# Altium footprint library burglar_alarm_system_Pcb_Lib.PcbLib: 36 footprints (part 1 of 3)
Each footprint in its own frame and in the unit in brackets; x right, y up, seen from the top. Pads: shape width x height; smd on the part's side, far side on the other; paste and mask are expansions set on the pad; w line width, h text height; cw(c..) or ccw(c..) is an arc to the next point about the centre after c.
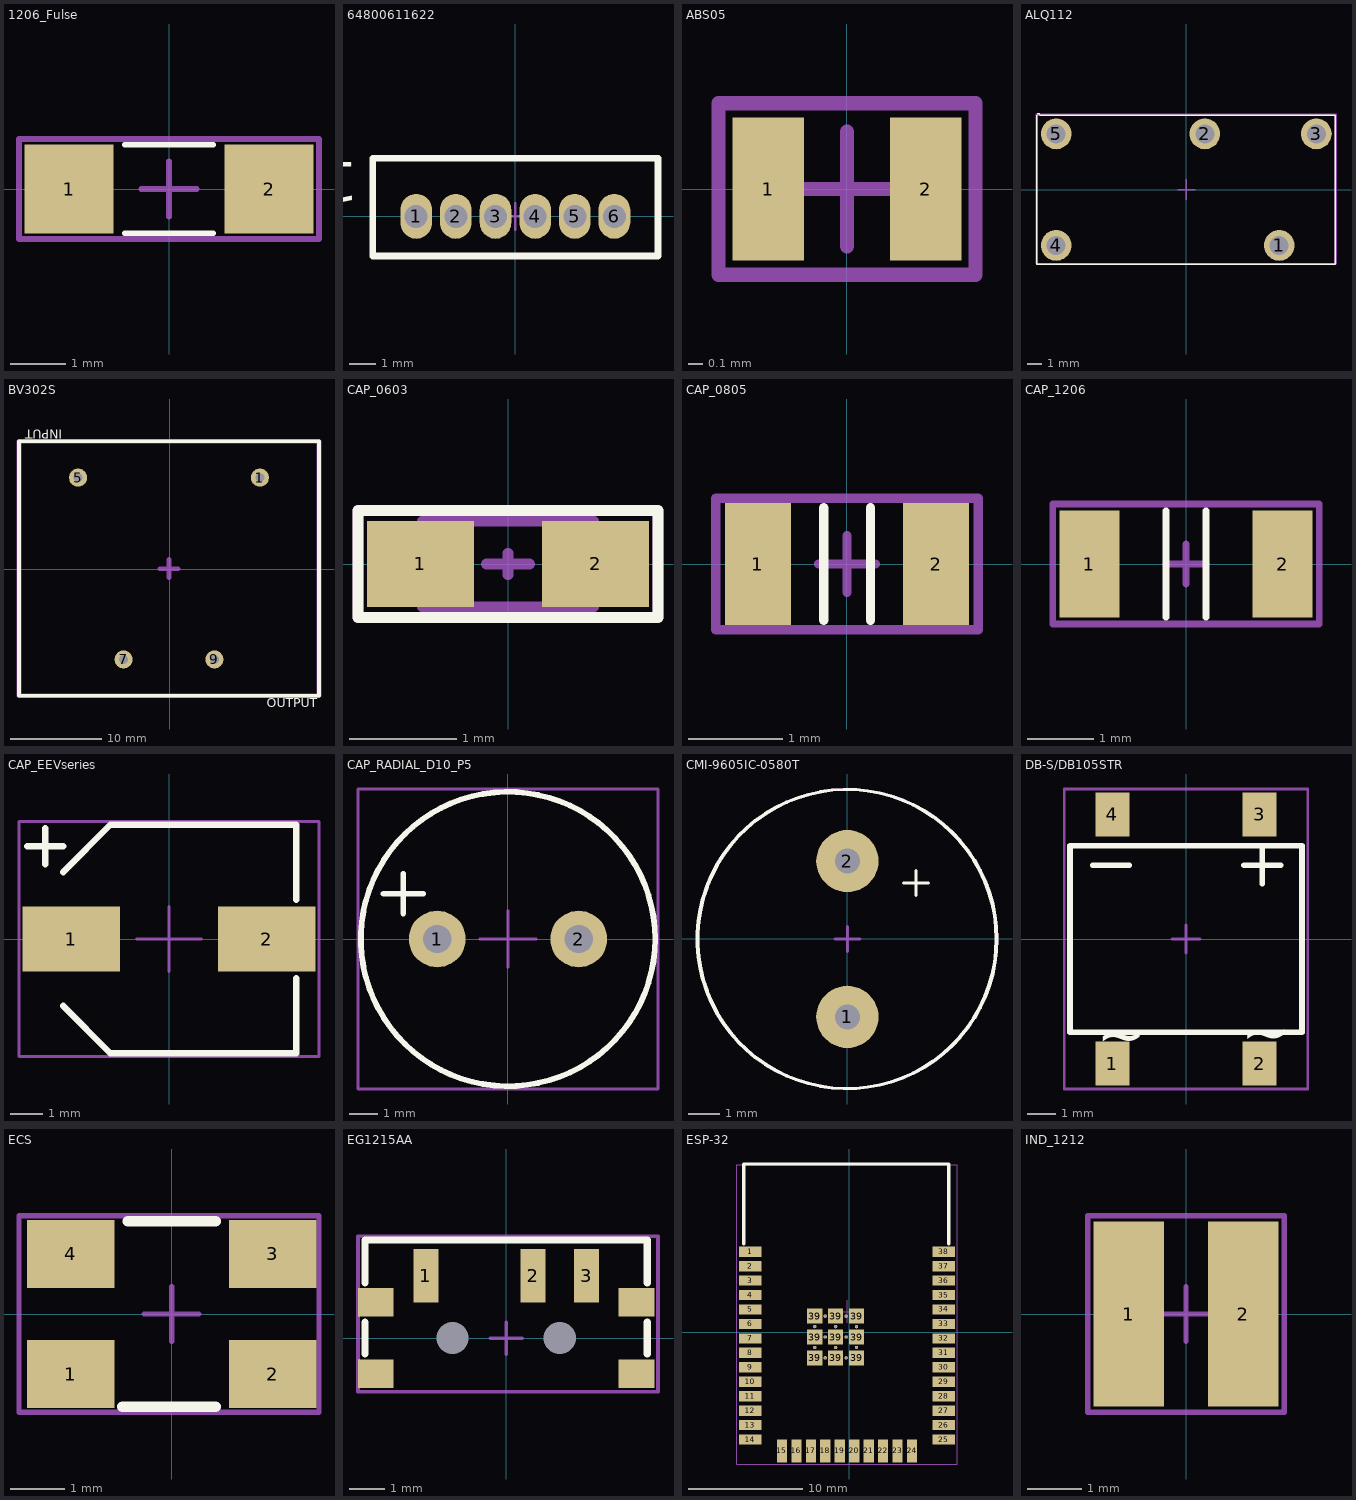
[diagram p0: the footprints below, top view; thin cyan lines are the x and y axes]

## 1206_Fulse [mm]
pads (2):
  rect 1.6x1.6 smd mask+0.05: 1(-1.8,0) 2(1.8,0)
Top Overlay:
  lines w0.1: -0.8,-0.8 0.8,-0.8 ; -0.8,0.8 0.8,0.8
Top Component Center:
  lines w0.1: -0.5,0 0.5,0 ; 0,-0.5 0,0.5 ; -2.7,-0.9 -2.7,0.9 -1.3,0.9 2.7,0.9 2.7,-0.9 -2.7,-0.9
Top Designator:
  lines w0.1: -2.7,-0.9 2.7,-0.9 2.7,0.9 -1.3,0.9 -2.7,0.9 -2.7,-0.9
  text ".Designator" at -2,-0.467 h1
3D body "e_0100.3479_003.step": height 0.64, standoff 0, extent -1.612,-0.8 1.612,0.8

## 64800611622 [mm]
pads (6):
  oval 1.2x1.7 hole 0.87 mask+0.05: 1(-3.75,0) 2(-2.25,0) 3(-0.75,0) 4(0.75,0) 5(2.25,0) 6(3.75,0)
Top Overlay:
  lines w0.25: -5.4,-1.5 -5.4,2.2 5.4,2.2 5.4,-1.5 -5.4,-1.5
  text "1" at -5.954,2.046 h1.52
Top Component Center:
  lines w0.1: -0.5,0 0.5,0 ; 0,-0.5 0,0.5 ; -5.4,-1.5 5.4,-1.5 5.4,2.2 -5.4,2.2 -5.4,-1.5
Top Designator:
  lines w0.1: -5.4,-1.5 -5.4,2.2 5.4,2.2 5.4,-1.5 -5.4,-1.5
  text "'.Designator'" at -4.046,-0.238 h1.52
3D body "64800611622 (rev1).stp": height 4.75, standoff -2.45, extent -5.25,-1.4 5.25,2.1

## ABS05 [mm]
pads (2):
  rect 0.5x1 smd mask+0.05: 1(-0.55,0) 2(0.55,0)
Top Component Center:
  lines w0.1: -0.4,0 0.4,0 ; 0,-0.4 0,0.4 ; -0.9,-0.6 0.9,-0.6 0.9,0.6 -0.9,0.6 -0.9,-0.6
Top Designator:
  lines w0.1: -0.9,-0.6 0.9,-0.6 0.9,0.6 -0.9,0.6 -0.9,-0.6
  text "'.Designator'" at -1,-0.367 h0.7
3D body "ABS05.STEP": height 0.5, standoff 0, extent -0.8,-0.5 0.8,0.5

## ALQ112 [mm]
pads (5):
  round 2.1 hole 1.3 mask+0.05: 1(6.35,-3.81) 2(1.27,3.81) 3(8.89,3.81) 4(-8.89,-3.81) 5(-8.89,3.81)
Top Overlay:
  lines w0.1: -10.22,5.09 -10.22,-5.11 10.18,-5.11 10.18,5.09 -10.02,5.09 ; -10.2,5.2 -10,5.2
Top Component Center:
  lines w0.1: -0.6,0 0,0 ; 0,-0.7 0,0 ; 0,0.7 0,0 ; 0.6,0 0,0 ; -10.22,-5.1 10.18,-5.1 10.18,5.1 -10.22,5.1 -10.22,-5.1
Top Designator:
  lines w0.1: -10.27,-5.06 10.23,-5.06 10.23,5.14 -10.27,5.14 -10.27,-5.06
  text ".DESİGNATOR" at -3.7,0.2 h1.1
3D body: height 15.6, standoff 0.4, extent -10,-5 10,5
3D body: height 0.2, standoff -4, extent 1.12,3.41 1.42,4.21
3D body: height 0, standoff -4.2, extent -9.39,3.31 -8.39,4.31
3D body: height 0, standoff -4.2, extent -9.39,-4.31 -8.39,-3.31
3D body: height 0.2, standoff -4, extent 8.74,3.41 9.04,4.21
3D body: height 0.2, standoff -4, extent 6.2,-4.21 6.5,-3.41

## BV302S [mm]
pads (4):
  round 2 hole 1 mask+0.05: 1(9.9,10.1) 5(-10.1,10.1) 7(-5.1,-9.9) 9(4.9,-9.9)
Top Overlay:
  lines w0.4: -16.6,-13.9 16.4,-13.9 16.4,14.1 -16.6,14.1 -16.6,-13.9
  text "INPUT" at -11.854,15.346 h1
  text "OUTPUT" at 10.654,-15.146 h1
Top Component Center:
  lines w0.5: -1.1,0.1 0.9,0.1 ; -0.1,-0.9 -0.1,1.1 ; -16.6,-13.9 -16.6,14.1 16.4,14.1 16.4,-13.9 -16.6,-13.9
Top Designator:
  lines w0.1: -16.6,-13.9 16.4,-13.9 16.4,14.1 -16.6,14.1 -16.6,-13.9
  text "'.Designator'" at -7.346,-0.138 h1.52
3D body "User Library-Hahn BV EI 302 2902.step": height 21.8, standoff -4.5, extent -16.35,-13.65 16.15,13.85

## CAP_0603 [mm]
pads (2):
  rect 1x0.8 smd mask+0.05: 1(-0.817,0) 2(0.818,0)
Top Overlay:
  lines w0.1: -1.4,-0.5 -1.4,0.5 1.4,0.5 1.4,-0.5 -1.4,-0.5
Top 3D Body:
  lines w0.1: -0.8,-0.4 0.8,-0.4 0.8,0.4 -0.8,0.4 -0.8,-0.4
Top Component Center:
  lines w0.1: -0.2,0 0,0 0.2,0 ; 0,-0.1 0,0.1 ; -1.4,-0.5 -1.4,0.5 1.4,0.5 1.4,-0.5 -1.4,-0.5
Top Designator:
  lines w0.1: -1.4,-0.5 1.4,-0.5 1.4,0.5 -1.4,0.5 -1.4,-0.5
  text ".Designator" at -1.3,-0.233 h0.5
3D body "CAP_0603.STEP": height 0.8, standoff -0.01, extent -0.8,-0.45 0.8,0.45

## CAP_0805 [mm]
pads (2):
  rect 0.7x1.3 smd mask+0.05: 1(-0.95,0) 2(0.95,0)
Top Overlay:
  lines w0.1: -0.25,-0.6 -0.25,0.6 ; 0.25,-0.6 0.25,0.6
Top Component Center:
  lines w0.1: -0.3,0 0.3,0 ; 0,-0.3 0,0.3 ; -1.4,-0.7 1.4,-0.7 1.4,0.7 -1.4,0.7 -1.4,-0.7
Top Designator:
  lines w0.1: -1.4,-0.7 1.4,-0.7 1.4,0.7 -1.4,0.7 -1.4,-0.7
  text "'.Designator'" at -1.25,-0.317 h0.7
3D body "CAPC0805.STEP": height 0.9, standoff 0, extent -1.301,-0.678 1.301,0.678

## CAP_1206 [mm]
pads (2):
  rect 0.9x1.6 smd mask+0.05: 1(-1.45,0) 2(1.45,0)
Top Overlay:
  lines w0.1: -0.3,-0.8 -0.3,0.8 ; 0.3,-0.8 0.3,0.8
Top Component Center:
  lines w0.1: -0.3,0 0.3,0 ; 0,-0.3 0,0.3 ; -2,-0.9 2,-0.9 2,0.9 -2,0.9 -2,-0.9
Top Designator:
  lines w0.1: -2,-0.9 2,-0.9 2,0.9 -2,0.9 -2,-0.9
  text "'.Designator'" at -1.25,-0.317 h0.7
3D body "CAPC1206.STEP": height 1.3, standoff -0.01, extent -1.975,-0.976 1.975,0.976

## CAP_EEVseries [mm]
pads (2):
  rect 3x2 smd mask+0.05: 1(-3,0) 2(3,0)
Top Overlay:
  lines w0.2: -4.35,2.85 -3.25,2.85 ; -3.8,2.3 -3.8,3.4 ; -3.25,-2.05 -1.8,-3.5 -1.5,-3.5 3.9,-3.5 3.9,-1.2 ; -3.25,2.05 -1.8,3.5 -1.5,3.5 3.9,3.5 3.9,1.2
Top Component Center:
  lines w0.1: -1,0 1,0 ; 0,-1 0,1 ; -4.6,-3.6 -4.6,3.6 4.6,3.6 4.6,-3.6 -4.6,-3.6
Top Designator:
  lines w0.1: -4.6,-3.6 -4.6,3.6 4.6,3.6 4.6,-3.6 -4.6,-3.6
  text "'.Designator'" at -2.846,-0.638 h1.52
3D body "EEV686M035A9HAA (1).step": height 8.01, standoff 0, extent -3.8,-3.4 3.8,3.4

## CAP_RADIAL_D10_P5 [mm]
pads (2):
  round 2 hole 1 mask+0.05: 1(-2.5,0) 2(2.5,0)
Top Overlay:
  circle w0.2: c0,0 r5.2
  lines w0.2: -4.4,1.6 -3,1.6 ; -3.7,0.9 -3.7,2.3
Top Component Center:
  lines w0.1: -1,0 1,0 ; 0,-1 0,1 ; -5.3,-5.3 -5.3,5.3 5.3,5.3 5.3,-5.3 -5.3,-5.3
Top Designator:
  lines w0.1: -5.3,-5.3 5.3,-5.3 5.3,5.3 -5.3,5.3 -5.3,-5.3
  text "'.Designator'" at -3.446,-0.938 h1.52
3D body "ESH477M050AH4AA (2).step": height 22.2, standoff -19.8, extent -5.25,-5.25 5.25,5.25

## CMI-9605IC-0580T [mm]
pads (2):
  round 2 hole 0.8 mask+0.05: 1(0,-2.5) 2(0,2.5)
Top Overlay:
  circle w0.1: c-0.026,0 r4.8
  circle w0.1: c0,0 r4.8
  lines w0.1: 1.8,1.8 2.2,1.8 2.6,1.8 ; 2.2,1.4 2.2,2.2
Top Component Center:
  circle w0.1: c0,0 r4.8
  lines w0.1: -0.4,0 0,0 ; 0,-0.4 0,0.4 0,0 ; 0.4,0 0,0
Top Designator:
  circle w0.1: c0,0 r4.8
  text ".DESİGNATOR" at -0.3,-0.1 h1.1
3D body: height 8, standoff 3, extent -4.775,-4.791 4.825,4.809
3D body: height 3.5, standoff -2, extent -0.3,2.2 0.3,2.8
3D body: height 3, standoff -1, extent -0.3,-2.8 0.3,-2.2
3D body: height 8.15, standoff 8.1, extent -3.998,-4.014 4.002,3.986

## DB-S/DB105STR [mm]
pads (4):
  rect 1.2x1.55 smd mask+0.05: 1(-2.605,-4.4) 2(2.605,-4.4) 3(2.605,4.4) 4(-2.605,4.4)
Top Overlay:
  lines w0.2: -3.3,2.6 -2,2.6 ; 2.05,2.6 3.35,2.6 ; 2.7,1.95 2.7,3.25 ; -4.1,-3.3 4.1,-3.3 4.1,3.3 -4.1,3.3 -4.1,-3.3
  text "~" at -3.146,-4.116 h1.52
  text "~" at 1.954,-4.016 h1.52
Top Component Center:
  lines w0.1: -0.5,0 0.5,0 ; 0,-0.5 0,0.5 ; -4.3,-5.3 4.3,-5.3 4.3,5.3 -4.3,5.3 -4.3,-5.3
Top Designator:
  lines w0.1: -4.3,-5.3 4.3,-5.3 4.3,5.3 -4.3,5.3 -4.3,-5.3
  text ".Designator" at -3,-0.067 h1
3D body "User Library-DB107S  DB-S (1).step": height 2.66, standoff 0, extent -4.16,-5.2 4.16,5.2

## ECS [mm]
pads (4):
  rect 1.6x1.25 smd mask+0.05: 1(-1.85,-1.1) 2(1.85,-1.1) 3(1.85,1.1) 4(-1.85,1.1)
Top Overlay:
  lines w0.2: -0.9,-1.7 0.8,-1.7 ; -0.8,1.7 0.8,1.7
Top Component Center:
  lines w0.1: -0.5,0 0.5,0 ; 0,-0.5 0,0.5 ; -2.8,-1.8 2.7,-1.8 2.7,1.8 -2.8,1.8 -2.8,-1.8
Top Designator:
  lines w0.1: -2.8,-1.8 2.7,-1.8 2.7,1.8 -2.8,1.8 -2.8,-1.8
  text "'.Designator'" at -2.246,-0.638 h1.52
3D body "ECS-160-20-30B-TR.STEP": height 0.85, standoff 0, extent -2.5,-1.6 2.5,1.6

## EG1215AA [mm]
pads (9):
  rect 0.7x1.5 smd mask+0.05: 1(-2.25,1.75) 2(0.75,1.75) 3(2.25,1.75)
  rect 1x0.8 smd mask+0.05: ""(-3.65,-1) ""(-3.65,1) ""(3.65,-1) ""(3.65,1)
  round 0 hole 0.9 mask+0.05: ""(-1.5,0) ""(1.5,0)
Top Overlay:
  lines w0.2: -3.95,-0.45 -3.95,0.45 ; -3.95,1.55 -3.95,2.75 3.95,2.75 3.95,1.55 ; 3.95,-0.45 3.95,0.45
Top Component Center:
  lines w0.1: -0.45,0 0.45,0 ; 0,-0.45 0,0.45 ; -4.15,-1.5 4.25,-1.5 4.25,2.85 -4.15,2.85 -4.15,-1.5
Top Designator:
  lines w0.1: -4.15,-1.5 4.25,-1.5 4.25,2.85 -4.15,2.85 -4.15,-1.5
  text ".Designator" at -2.746,0.112 h1.52
3D body "EG1215AA--3DModel-STEP-56544 (1).STEP": height 1.38, standoff -0.32, extent -3.85,-2.7 3.85,2.2

## ESP-32 [mm]
pads (59):
  rect 2x0.9 smd mask+0.05: 1(-8.7,7.06) 2(-8.7,5.79) 3(-8.7,4.52) 4(-8.7,3.25) 5(-8.7,1.98) 6(-8.7,0.71) 7(-8.7,-0.56) 8(-8.7,-1.83) 9(-8.7,-3.1) 10(-8.7,-4.37) 11(-8.7,-5.64) 12(-8.7,-6.91) 13(-8.7,-8.18) 14(-8.7,-9.45) 25(8.3,-9.45) 26(8.3,-8.18) 27(8.3,-6.91) 28(8.3,-5.64) 29(8.3,-4.37) 30(8.3,-3.1) 31(8.3,-1.83) 32(8.3,-0.56) 33(8.3,0.71) 34(8.3,1.98) 35(8.3,3.25) 36(8.3,4.52) 37(8.3,5.79) 38(8.3,7.06)
  rect 0.9x2 smd mask+0.05: 15(-5.915,-10.45) 16(-4.645,-10.45) 17(-3.375,-10.45) 18(-2.105,-10.45) 19(-0.835,-10.45) 20(0.435,-10.45) 21(1.705,-10.45) 22(2.975,-10.45) 23(4.245,-10.45) 24(5.515,-10.45)
  rect 1.33x1.33 smd mask+0.05: 39(-3.035,-2.275) 39(-3.035,-0.44) 39(-3.035,1.395) 39(-1.2,-2.275) 39(-1.2,-0.44) 39(-1.2,1.395) 39(0.635,-2.275) 39(0.635,-0.44) 39(0.635,1.395)
  round 0.3 hole 0.2 mask+0.05: 39(-3.035,-1.357) 39(-3.035,0.478) 39(-2.118,-2.275) 39(-2.118,-0.44) 39(-2.118,1.395) 39(-1.2,-1.357) 39(-1.2,0.478) 39(-0.283,-2.275) 39(-0.283,-0.44) 39(-0.283,1.395) 39(0.635,-1.357) 39(0.635,0.478)
Top Overlay:
  lines w0.3: -9.271,7.768 -9.271,14.768 8.729,14.768 8.729,7.768
Top Component Center:
  lines w0.1: -1.2,1.8 0.8,1.8 ; -0.2,0.8 -0.2,2.8 ; -9.9,-11.6 -9.9,14.7 9.5,14.7 9.5,-11.6 -9.9,-11.6
Top Designator:
  lines w0.1: -9.9,-11.6 -9.9,14.7 9.5,14.7 9.5,-11.6 -9.9,-11.6
  text ".Designator" at -4.046,2.562 h1.52
3D body "ESP-32 .step": height 2.61, standoff -0.1, extent -9.174,-10.8 8.726,14.6

## IND_1212 [mm]
pads (2):
  rect 1.3x3.4 smd mask+0.05: 1(-1.05,0) 2(1.05,0)
Top Component Center:
  lines w0.1: -0.5,0 0.5,0 ; 0,-0.5 0,0.5 ; -1.8,-1.8 1.8,-1.8 1.8,1.8 -1.8,1.8 -1.8,-1.8
Top Designator:
  lines w0.1: -1.8,-1.8 1.8,-1.8 1.8,1.8 -1.8,1.8 -1.8,-1.8
  text "'.Designator'" at -1.6,-0.5 h1.5
3D body "78438335010_Download_STP_WE-MAIA-3015_rev1 (1).stp": height 1.2, standoff 0, extent -1.5,-1.5 1.5,1.5